# Altium footprint library Common Components.PcbLib: 94 footprints (part 3 of 6)
Each footprint in its own frame and in the unit in brackets; x right, y up, seen from the top. Pads: shape width x height; smd on the part's side, far side on the other; paste and mask are expansions set on the pad; w line width, h text height; cw(c..) or ccw(c..) is an arc to the next point about the centre after c.
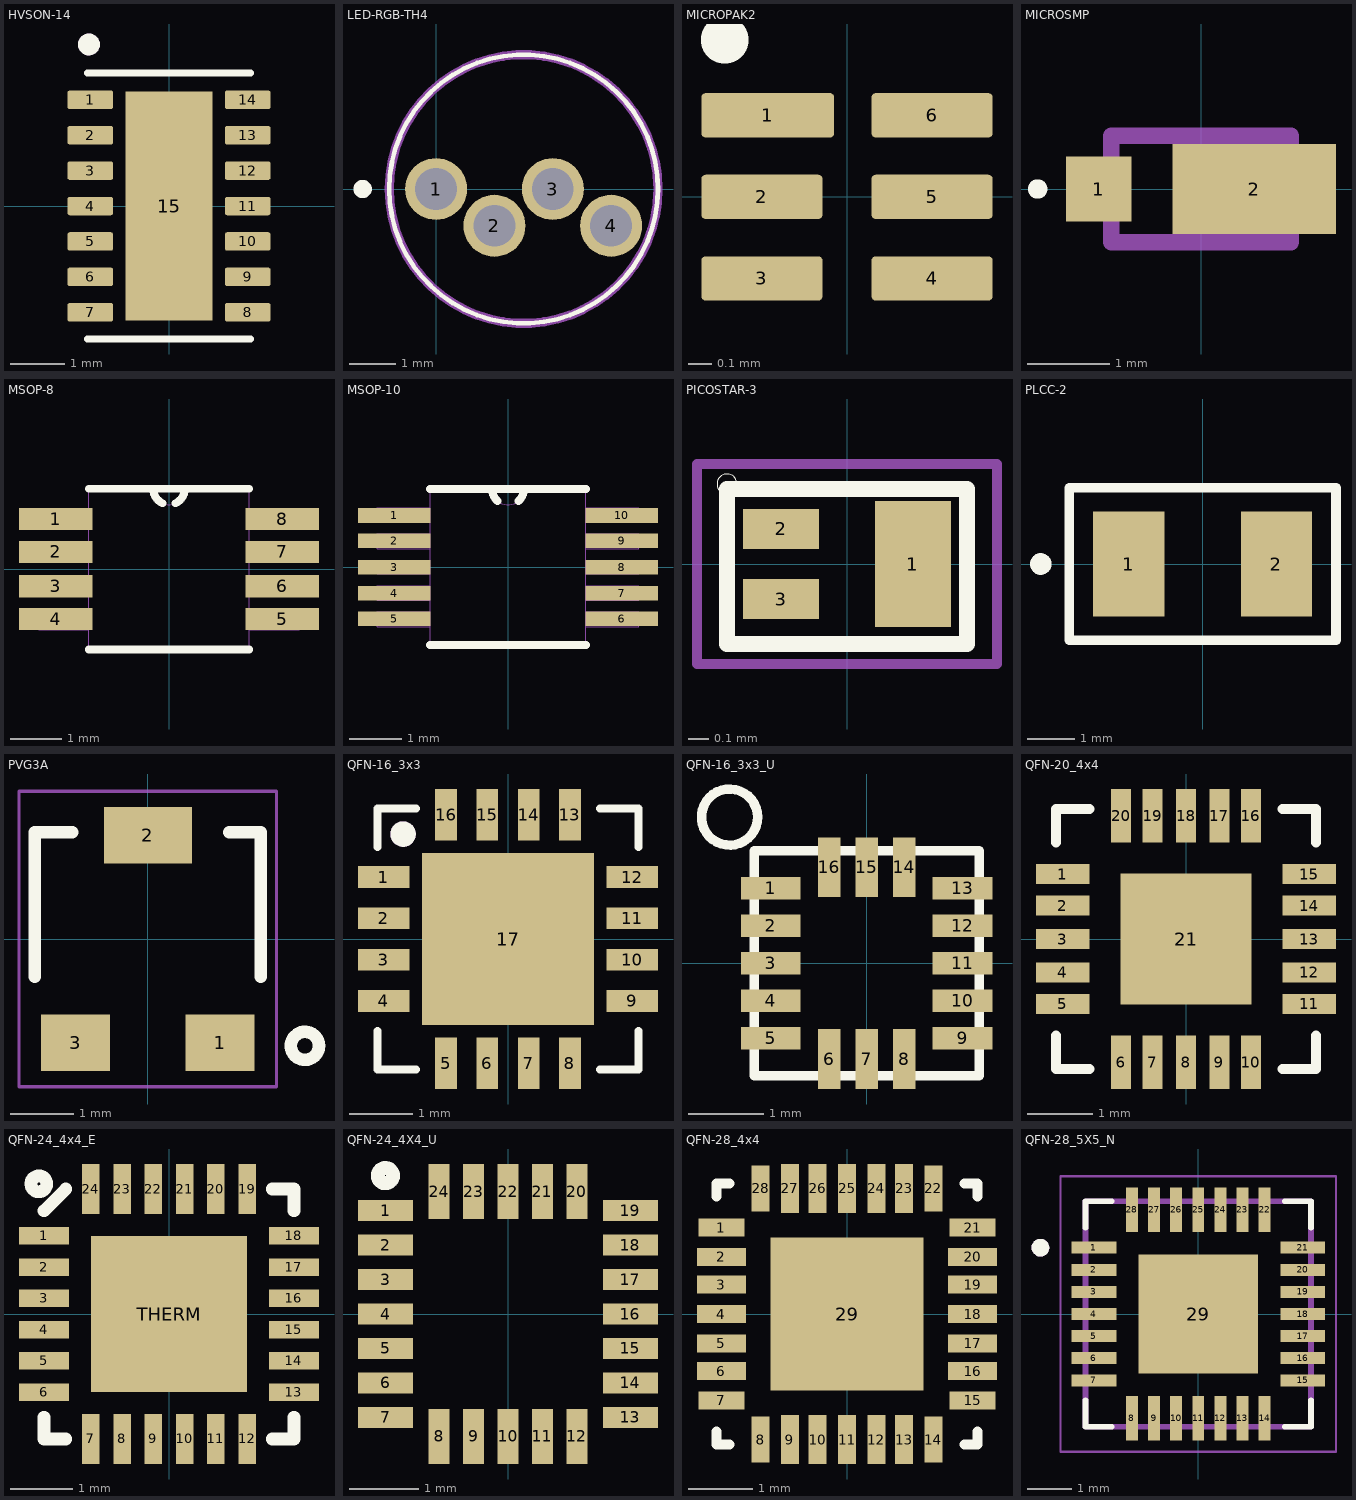
[diagram p2: the footprints below, top view; thin cyan lines are the x and y axes]

## HVSON-14 [mm]
pads (15):
  rrect25% 0.84x0.34 smd: 1(-1.445,1.95) 2(-1.445,1.3) 3(-1.445,0.65) 4(-1.445,0) 5(-1.445,-0.65) 6(-1.445,-1.3) 7(-1.445,-1.95) 8(1.445,-1.95) 9(1.445,-1.3) 10(1.445,-0.65) 11(1.445,0) 12(1.445,0.65) 13(1.445,1.3) 14(1.445,1.95)
  rect 1.6x4.2 smd paste-3: 15(0,0)
Top Overlay:
  circle w0.2: c-1.469,2.966 r0.1
  lines w0.127: -1.5,-2.44 1.5,-2.44 ; -1.5,2.44 1.5,2.44
Top Paste:
  region: 0.51,-1.33 -0.51,-1.33 -0.51,1.33 0.51,1.33
Mechanical 13:
  circle w0.2: c-1.469,2.966 r0.1
3D body "HVSON-14.step": height 0.86, standoff 0.01, extent -1.5,-2.25 1.5,2.25

## LED-RGB-TH4 [mm]
pads (4):
  round 1.35 hole 0.91: 1(0,0) 2(1.27,-0.8) 3(2.54,0) 4(3.81,-0.8)
Top Overlay:
  lines w0.1: -1.02,0 cw(c1.905,0) 4.83,0 cw(c1.905,0) -1.02,0
  lines w0.2: -1.6,-0.1 ccw(c-1.6,0) -1.6,0.1 ccw(c-1.6,0) -1.6,-0.1
Mechanical 13:
  lines w0.2: -1.02,0 cw(c1.905,0) 4.83,0 cw(c1.905,0) -1.02,0
3D body "LED-TH4-RGB.step": height 8.61, standoff -8.99, extent -0.791,-2.948 4.659,2.947

## MICROPAK2 [mm]
pads (6):
  rrect18% 0.57x0.19 smd mask+0.14: 1(-0.34,0.35)
  rrect18% 0.52x0.19 smd mask+0.14: 2(-0.365,0) 3(-0.365,-0.35) 4(0.365,-0.35) 5(0.365,0) 6(0.365,0.35)
Top Overlay:
  circle w0.2: c-0.525,0.675 r0.003
3D body "MICROPAK2-6_1X1_ONS.step": height 0.56, standoff 0, extent -0.495,-0.495 0.495,0.495

## MICROSMP [mm]
pads (2):
  rect 0.8x0.8 smd: 1(-1.25,0)
  rect 2x1.1 smd: 2(0.65,0)
Top Overlay:
  circle w0.2: c-2,0 r0.019
Mechanical 13:
  lines w0.2: -1.1,-0.65 1.1,-0.65 1.1,0.65 -1.1,0.65 -1.1,-0.65
3D body "DIODE_MICROSMP.step": height 0.76, standoff 0.01, extent -1.25,-0.65 1.25,0.65

## MSOP-8 [mil]
pads (8):
  rect 56x17 smd mask+4.72: 1(-86,38) 2(-86,13) 3(-86,-13) 4(-86,-38) 5(86,-38) 6(86,-13) 7(86,13) 8(86,38)
Top Overlay:
  lines w6: -61,-61 61,-61 ; -61,61 -12,61 ; -4.99,50 cw(c0.48,61.21) -12,60.99 ; 4.99,50 ccw(c-0.48,61.21) 12,60.99 ; 61,61 12,61 ; -12,61 12,61
Mechanical 13:
  lines w0: -99,-46 -61,-46 ; -99,-46 -99,-31 ; -99,-46 -61,-46 ; -99,-46 -99,-31 ; -99,-31 -61,-31 ; -99,-31 -61,-31 ; -99,-20 -61,-20 ; -99,-20 -99,-5 ; -99,-20 -61,-20 ; -99,-20 -99,-5 ; -99,-5 -61,-5 ; -99,-5 -61,-5 ; -99,5 -61,5 ; -99,5 -99,20 ; -99,5 -61,5 ; -99,5 -99,20 ; -99,20 -61,20 ; -99,20 -61,20 ; -99,31 -61,31 ; -99,31 -99,46 ; -99,31 -61,31 ; -99,31 -99,46 ; -99,46 -61,46 ; -99,46 -61,46 ; -61,-61 -61,61 ; -61,-61 61,-61 ; -61,-61 -61,61 ; -61,-61 61,-61 ; -61,-46 -61,-31 ; -61,-46 -61,-31 ; -61,-20 -61,-5 ; -61,-20 -61,-5 ; -61,5 -61,20 ; -61,5 -61,20 ; -61,31 -61,46 ; -61,31 -61,46 ; -61,61 -12,61 ; -61,61 -12,61 ; -12,61 ccw(c0,61) 12,61 ; -12,61 ccw(c0,61) 12,61 ; -12,61 12,61 ; -12,61 12,61 ; 12,61 61,61 ; 12,61 61,61 ; 61,-61 61,61 ; 61,-61 61,61 ; 61,-46 99,-46 ; 61,-46 61,-31 ; 61,-46 99,-46 ; 61,-46 61,-31 ; 61,-31 99,-31 ; 61,-31 99,-31 ; 61,-20 99,-20 ; 61,-20 61,-5 ; 61,-20 99,-20 ; 61,-20 61,-5 ; 61,-5 99,-5 ; 61,-5 99,-5 ; 61,5 99,5 ; 61,5 61,20 ; 61,5 99,5 ; 61,5 61,20 ; 61,20 99,20 ; 61,20 99,20 ; 61,31 99,31 ; 61,31 61,46 ; 61,31 99,31 ; 61,31 61,46 ; 61,46 99,46 ; 61,46 99,46 ; 99,-46 99,-31 ; 99,-46 99,-31 ; 99,-20 99,-5 ; 99,-20 99,-5 ; 99,5 99,20 ; 99,5 99,20 ; 99,31 99,46 ; 99,31 99,46
3D body "MSOP-8.step": height 41.84, standoff -1.47, extent -95.2,-61.03 99.2,61.02

## MSOP-10 [mil]
pads (10):
  rect 55x11 smd: 1(-86,39) 2(-86,20) 3(-86,0) 4(-86,-20) 5(-86,-39) 6(86,-39) 7(86,-20) 8(86,0) 9(86,20) 10(86,39)
Top Overlay:
  lines w6: -59,-59 59,-59 ; -59,59 -12,59 ; -7.99,49.99 cw(c0.11,58.99) -12,58.99 ; 7.99,49.99 ccw(c-0.11,58.99) 12,58.99 ; 59,59 12,59 ; -12,59 12,59
Mechanical 13:
  lines w0: -99,-45 -99,-34 ; -99,-45 -59,-45 ; -99,-45 -99,-34 ; -99,-45 -59,-45 ; -99,-34 -59,-34 ; -99,-34 -59,-34 ; -99,-25 -99,-14 ; -99,-25 -59,-25 ; -99,-25 -99,-14 ; -99,-25 -59,-25 ; -99,-14 -59,-14 ; -99,-14 -59,-14 ; -99,-5 -99,5 ; -99,-5 -59,-5 ; -99,-5 -99,5 ; -99,-5 -59,-5 ; -99,5 -59,5 ; -99,5 -59,5 ; -99,14 -99,25 ; -99,14 -59,14 ; -99,14 -99,25 ; -99,14 -59,14 ; -99,25 -59,25 ; -99,25 -59,25 ; -99,34 -99,45 ; -99,34 -59,34 ; -99,34 -99,45 ; -99,34 -59,34 ; -99,45 -59,45 ; -99,45 -59,45 ; -59,-59 59,-59 ; -59,-59 -59,59 ; -59,-59 59,-59 ; -59,-59 -59,59 ; -59,-45 -59,-34 ; -59,-45 -59,-34 ; -59,-25 -59,-14 ; -59,-25 -59,-14 ; -59,-5 -59,5 ; -59,-5 -59,5 ; -59,14 -59,25 ; -59,14 -59,25 ; -59,34 -59,45 ; -59,34 -59,45 ; -59,59 -12,59 ; -59,59 -12,59 ; -12,59 ccw(c0,59) 12,59 ; -12,59 ccw(c0,59) 12,59 ; -12,59 12,59 ; -12,59 12,59 ; 12,59 59,59 ; 12,59 59,59 ; 59,-59 59,59 ; 59,-59 59,59 ; 59,-45 59,-34 ; 59,-45 59,-34 ; 59,-45 99,-45 ; 59,-45 99,-45 ; 59,-34 99,-34 ; 59,-34 99,-34 ; 59,-25 59,-14 ; 59,-25 99,-25 ; 59,-25 59,-14 ; 59,-25 99,-25 ; 59,-14 99,-14 ; 59,-14 99,-14 ; 59,-5 59,5 ; 59,-5 99,-5 ; 59,-5 59,5 ; 59,-5 99,-5 ; 59,5 99,5 ; 59,5 99,5 ; 59,14 59,25 ; 59,14 99,14 ; 59,14 59,25 ; 59,14 99,14 ; 59,25 99,25 ; 59,25 99,25 ; 59,34 59,45 ; 59,34 99,34 ; 59,34 59,45 ; 59,34 99,34 ; 59,45 99,45 ; 59,45 99,45 ; 99,-45 99,-34 ; 99,-45 99,-34 ; 99,-25 99,-14 ; 99,-25 99,-14 ; 99,-5 99,5 ; 99,-5 99,5 ; 99,14 99,25 ; 99,14 99,25 ; 99,34 99,45 ; 99,34 99,45
3D body "MSOP-10.step": height 45.28, standoff 0, extent -98.45,-59.05 94.46,59.06

## PICOSTAR-3 [mm]
pads (3):
  rect 0.38x0.63 smd mask+0: 1(0.33,0)
  rect 0.38x0.2 smd mask+0: 2(-0.33,0.175) 3(-0.33,-0.175)
Top Overlay:
  circle w0: c-0.6,0.4 r0.05
  lines w0.08: -0.6,-0.4 0.6,-0.4 0.6,0.375 -0.6,0.375 -0.6,-0.4
Mechanical 15:
  lines w0.05: -0.75,-0.5 0.75,-0.5 0.75,0.5 -0.75,0.5 -0.75,-0.5
3D body "step_temp.STEP": height 0.35, standoff 0, extent -0.5,-0.3 0.5,0.3

## PLCC-2 [mm]
pads (2):
  rect 1.5x2.2 smd: 1(-1.55,0) 2(1.55,0)
Top Overlay:
  circle w0.254: c-3.4,0 r0.1
  lines w0.2: -2.8,-1.6 2.8,-1.6 2.8,1.6 -2.8,1.6 -2.8,0.3 -2.8,-1.6
3D body "PLCC-2.STEP": height 1.91, standoff 0.01, extent -1.75,-1.4 1.75,1.4

## PVG3A [mm]
pads (3):
  rect 1.1x0.9 smd: 1(1.15,-1.65) 3(-1.15,-1.65)
  rect 1.4x0.9 smd: 2(0,1.65)
Top Overlay:
  circle w0.2: c2.5,-1.7 r0.224
  lines w0.2: -1.8,-0.6 -1.8,1.7 -1.2,1.7 ; 1.3,1.7 1.8,1.7 1.8,-0.6
Mechanical 15:
  lines w0.05: -2.05,-2.35 -2.05,2.35 2.05,2.35 2.05,-2.35 -2.05,-2.35
3D body "step_temp.STEP": height 2, standoff 0, extent -1.8,-1.8 1.8,1.8

## QFN-16_3x3 [mm]
pads (17):
  rect 0.81x0.34 smd: 1(-1.955,0.975) 2(-1.955,0.325) 3(-1.955,-0.325) 4(-1.955,-0.975) 9(1.955,-0.975) 10(1.955,-0.325) 11(1.955,0.325) 12(1.955,0.975)
  rect 0.34x0.81 smd: 5(-0.975,-1.955) 6(-0.325,-1.955) 7(0.325,-1.955) 8(0.975,-1.955) 13(0.975,1.955) 14(0.325,1.955) 15(-0.325,1.955) 16(-0.975,1.955)
  rect 2.7x2.7 smd: 17(0,0)
Top Overlay:
  circle w0.2: c-1.651,1.651 r0.1
  lines w0.127: -2.05,-1.45 -2.05,-2.05 -1.45,-2.05 ; -2.05,1.45 -2.05,2.05 -1.45,2.05 ; 1.45,-2.05 2.05,-2.05 2.05,-1.45 ; 1.45,2.05 2.05,2.05 2.05,1.45
Top Paste:
  region: -0.853,0.853 0.853,0.853 0.853,-0.853 -0.853,-0.853
Mechanical 13:
  circle w0.2: c-1.651,1.651 r0.1
  circle w0.2: c-1.651,1.651 r0.1
3D body "QFN-16_4x4.step": height 0.92, standoff 0, extent -2,-2 2,2

## QFN-16_3x3_U [mm]
pads (16):
  rect 0.8x0.3 smd mask+0.051: 1(-1.28,1) 2(-1.28,0.5) 3(-1.28,0) 4(-1.28,-0.5) 5(-1.28,-1) 9(1.28,-1) 10(1.28,-0.5) 11(1.28,0) 12(1.28,0.5) 13(1.28,1)
  rect 0.3x0.8 smd mask+0.051: 6(-0.5,-1.28) 7(0,-1.28) 8(0.5,-1.28) 14(0.5,1.28) 15(0,1.28) 16(-0.5,1.28)
Top Overlay:
  circle w0.127: c-1.83,1.95 r0.375
  lines w0.127: -1.5,-1.5 1.5,-1.5 1.5,1.5 -1.5,1.5 -1.5,-1.5
3D body "QFN-16_3x3.step": height 0.9, standoff 0, extent -1.524,-1.521 1.518,1.521

## QFN-20_4x4 [mil]
pads (21):
  rect 32x12 smd mask+2: 1(-74,39) 2(-74,20) 3(-74,0) 4(-74,-20) 5(-74,-39) 11(74,-39) 12(74,-20) 13(74,0) 14(74,20) 15(74,39)
  rect 12x32 smd mask+2: 6(-39,-74) 7(-20,-74) 8(0,-74) 9(20,-74) 10(39,-74) 16(39,74) 17(20,74) 18(0,74) 19(-20,74) 20(-39,74)
  rect 78.74x78.74 smd mask+3: 21(0,0)
Top Overlay:
  lines w6: -78,-58 -78,-78 -58,-78 ; -78,58 -78,78 -58,78 ; 58,-78 78,-78 78,-58 ; 58,78 78,78 78,58
3D body "QFN-20_4x4.step": height 32, standoff 0.5, extent -79,-79 79.27,79.27

## QFN-24_4x4_E [mm]
pads (25):
  rect 0.8x0.28 smd mask+0.051: 1(-2,1.25) 2(-2,0.75) 3(-2,0.25) 4(-2,-0.25) 5(-2,-0.75) 6(-2,-1.25) 13(2,-1.25) 14(2,-0.75) 15(2,-0.25) 16(2,0.25) 17(2,0.75) 18(2,1.25)
  rect 0.28x0.8 smd mask+0.051: 7(-1.25,-2) 8(-0.75,-2) 9(-0.25,-2) 10(0.25,-2) 11(0.75,-2) 12(1.25,-2) 19(1.25,2) 20(0.75,2) 21(0.25,2) 22(-0.25,2) 23(-0.75,2) 24(-1.25,2)
  rect 2.5x2.5 smd mask+0.051: THERM(0,0)
Top Overlay:
  circle w0.203: c-2.083,2.083 r0.127
  lines w0.203: -2,-1.65 -2,-2 -1.65,-2 ; -2,1.65 -1.65,2 ; 1.65,-2 2,-2 2,-1.65 ; 1.65,2 2,2 2,1.65
Top Paste:
  region: -1.2,-0.6 -0.6,-0.6 -0.6,-1.2 -1.2,-1.2
  region: -0.3,0.3 0.3,0.3 0.3,-0.3 -0.3,-0.3
  region: -1.2,0.3 -0.6,0.3 -0.6,-0.3 -1.2,-0.3
  region: -1.2,1.2 -0.6,1.2 -0.6,0.6 -1.2,0.6
  region: 0.6,1.2 1.2,1.2 1.2,0.6 0.6,0.6
  region: 0.6,-0.6 1.2,-0.6 1.2,-1.2 0.6,-1.2
  region: 0.6,0.3 1.2,0.3 1.2,-0.3 0.6,-0.3
  region: -0.3,1.2 0.3,1.2 0.3,0.6 -0.3,0.6
  region: -0.3,-0.6 0.3,-0.6 0.3,-1.2 -0.3,-1.2

## QFN-24_4X4_U [mm]
pads (24):
  rect 0.8x0.3 smd mask+0.051: 1(-1.775,1.5) 2(-1.775,1) 3(-1.775,0.5) 4(-1.775,0) 5(-1.775,-0.5) 6(-1.775,-1) 7(-1.775,-1.5) 13(1.775,-1.5) 14(1.775,-1) 15(1.775,-0.5) 16(1.775,0) 17(1.775,0.5) 18(1.775,1) 19(1.775,1.5)
  rect 0.3x0.8 smd mask+0.051: 8(-1,-1.775) 9(-0.5,-1.775) 10(0,-1.775) 11(0.5,-1.775) 12(1,-1.775) 20(1,1.775) 21(0.5,1.775) 22(0,1.775) 23(-0.5,1.775) 24(-1,1.775)
Top Overlay:
  circle w0.2: c-1.778,2.007 r0.111
3D body "QFN-28_4x4.step": height 0.75, standoff 0, extent -2,-2.019 2,1.981

## QFN-28_4x4 [mil]
pads (29):
  rect 28x11 smd mask+2: 1(-77,53) 7(-77,-53) 15(77,-53) 21(77,53)
  rect 30x11 smd mask+2: 2(-77,35) 3(-77,18) 4(-77,0) 5(-77,-18) 6(-77,-35) 16(77,-35) 17(77,-18) 18(77,0) 19(77,18) 20(77,35)
  rect 11x28 smd mask+2: 8(-53,-77) 14(53,-77) 22(53,77) 28(-53,77)
  rect 11x30 smd mask+2: 9(-35,-77) 10(-18,-77) 11(0,-77) 12(18,-77) 13(35,-77) 23(35,77) 24(18,77) 25(0,77) 26(-18,77) 27(-35,77)
  rect 94x94 smd: 29(0,0)
Top Overlay:
  lines w6: -80,-72 -80,-80 -72,-80 ; -80,72 -80,80 -72,80 ; 72,-80 80,-80 80,-72 ; 72,80 80,80 80,72
3D body "QFN-28_4x4.step": height 29.53, standoff 0, extent -77.48,-78.74 80,78.74

## QFN-28_5X5_N [mm]
pads (29):
  rect 1.01x0.27 smd: 1(-2.36,1.5) 2(-2.36,1) 3(-2.36,0.5) 4(-2.36,0) 5(-2.36,-0.5) 6(-2.36,-1) 7(-2.36,-1.5) 15(2.36,-1.5) 16(2.36,-1) 17(2.36,-0.5) 18(2.36,0) 19(2.36,0.5) 20(2.36,1) 21(2.36,1.5)
  rect 0.27x1.01 smd: 8(-1.5,-2.36) 9(-1,-2.36) 10(-0.5,-2.36) 11(0,-2.36) 12(0.5,-2.36) 13(1,-2.36) 14(1.5,-2.36) 22(1.5,2.36) 23(1,2.36) 24(0.5,2.36) 25(0,2.36) 26(-0.5,2.36) 27(-1,2.36) 28(-1.5,2.36)
  rect 2.7x2.7 smd: 29(0,0)
Top Overlay:
  circle w0.2: c-3.57,1.5 r0.1
  lines w0.127: -2.55,-1.955 -2.55,-2.55 -1.955,-2.55 ; -2.55,1.955 -2.55,2.55 -1.955,2.55 ; 1.955,-2.55 2.55,-2.55 2.55,-1.955 ; 1.955,2.55 2.55,2.55 2.55,1.955
Top Paste:
  region: -0.85,0.85 0.85,0.85 0.85,-0.85 -0.85,-0.85
Mechanical 13:
  circle w0.2: c-3.57,1.5 r0.1
  circle w0.2: c-3.57,1.5 r0.1
  lines w0.127: -2.55,-2.55 -2.55,2.55 ; -2.55,-2.55 2.55,-2.55 ; -2.55,-2.55 -2.55,2.55 ; -2.55,-2.55 2.55,-2.55 ; -2.55,2.55 2.55,2.55 ; -2.55,2.55 2.55,2.55 ; 2.55,-2.55 2.55,2.55 ; 2.55,-2.55 2.55,2.55
Mechanical 15:
  lines w0.05: -3.115,-3.115 -3.115,3.115 3.115,3.115 3.115,-3.115 -3.115,-3.115
3D body "QFN-28_5x5.step": height 1, standoff 0, extent -2.485,-2.5 2.515,2.5